# Altium integrated library Samtec_2_mm_Pitch_Socket_Strips.IntLib: 251 symbols (part 1 of 3) (continued)
## MMS-104-01-T-SV
designator J?
Tiger Claw(TM) Socket Strip, Through-hole, Vertical, -55 to 105 degC, 2 mm Pitch, 4-Pin, Female, RoHS; Manufacturer: Samtec; PartNumber: MMS-104-01-T-SV; Pitch: 2 mm; DatasheetVersion: F-214; PackageVersion: AO, 2/1993; PackageReference: MMS-104-01-X-SV; PackageDescription: 2mm Through Hole Box Connector Strip Assembly; Supplier 1: Digi-Key; Supplier Part Number 1: SAM1234-04-ND; Supplier 2: Newark; Supplier Part Number 2: 11P5302; Orientation: Vertical; RoHS: True; Temperature Range: -55 to 105 degC; Mounting Technology: Through-hole; ComponentLink1Description: Manufacturer URL; ComponentLink1URL: http://www.samtec.com; ComponentLink2Description: Datasheet; ComponentLink2URL: http://www.samtec.com/documents/webfiles/pdf/MMS.PDF; ComponentLink3Description: Package Specification; ComponentLink3URL: http://www.samtec.com/documents/webfiles/cpdf/MMS-1XX-01-XXX-XX-XXX-MKT1.pdf
footprint SMTC-MMS-104-01-X-SV (Through Hole Box Connector Strip Assembly, 1x4 Pins, Vertical, 2mm Pitch, Female)
pins: 1, 2, 3, 4

## MMS-104-02-F-DV
designator J?
Tiger Claw(TM) Socket Strip, Surface Mount, Vertical, -55 to 125 degC, 2 mm Pitch, 8-Pin, Female, RoHS; Manufacturer: Samtec; PartNumber: MMS-104-02-F-DV; Pitch: 2 mm; DatasheetVersion: F-214; PackageVersion: CI, 4/1994; PackageReference: MMS-104-02-X-DV; PackageDescription: 2mm Surface Mount Box Connector Strip ASM; Orientation: Vertical; RoHS: True; Temperature Range: -55 to 125 degC; Mounting Technology: Surface Mount; ComponentLink1Description: Manufacturer URL; ComponentLink1URL: http://www.samtec.com; ComponentLink2Description: Datasheet; ComponentLink2URL: http://www.samtec.com/documents/webfiles/pdf/MMS.PDF; ComponentLink3Description: Package Specification; ComponentLink3URL: http://www.samtec.com/documents/webfiles/cpdf/MMS-1XX-02-XXX-XX-XX-XXX-MKT.pdf
footprint SMTC-MMS-104-02-X-DV (Surface Mount Box Connector Strip ASM, 2x4 Pins, Vertical, 2mm Pitch, Female)
pins: 1, 2, 3, 4, 5, 6, 7, 8

## MMS-104-02-F-SH
designator J?
Tiger Claw(TM) Socket Strip, Surface Mount, Horizontal, -55 to 125 degC, 2 mm Pitch, 8-Pin, Female, RoHS; Manufacturer: Samtec; PartNumber: MMS-104-02-F-SH; Pitch: 2 mm; DatasheetVersion: F-214; PackageVersion: CI, 4/1994; PackageReference: MMS-104-02-X-SH; PackageDescription: 2mm Surface Mount Box Connector Strip ASM; Orientation: Horizontal; RoHS: True; Temperature Range: -55 to 125 degC; Mounting Technology: Surface Mount; ComponentLink1Description: Manufacturer URL; ComponentLink1URL: http://www.samtec.com; ComponentLink2Description: Datasheet; ComponentLink2URL: http://www.samtec.com/documents/webfiles/pdf/MMS.PDF; ComponentLink3Description: Package Specification; ComponentLink3URL: http://www.samtec.com/documents/webfiles/cpdf/MMS-1XX-02-XXX-XX-XX-XXX-MKT.pdf
footprint SMTC-MMS-104-02-X-SH (Surface Mount Box Connector Strip ASM, 2x4 Pins, Horizontal, 2mm Pitch, Female)
pins: 1A, 1B, 2A, 2B, 3A, 3B, 4A, 4B

## MMS-104-02-F-SV
designator J?
Tiger Claw(TM) Socket Strip, Surface Mount, Vertical, -55 to 125 degC, 2 mm Pitch, 4-Pin, Female, RoHS; Manufacturer: Samtec; PartNumber: MMS-104-02-F-SV; Pitch: 2 mm; DatasheetVersion: F-214; PackageVersion: CI, 4/1994; PackageReference: MMS-104-02-X-SV; PackageDescription: 2mm Surface Mount Box Connector Strip ASM; Orientation: Vertical; RoHS: True; Temperature Range: -55 to 125 degC; Mounting Technology: Surface Mount; ComponentLink1Description: Manufacturer URL; ComponentLink1URL: http://www.samtec.com; ComponentLink2Description: Datasheet; ComponentLink2URL: http://www.samtec.com/documents/webfiles/pdf/MMS.PDF; ComponentLink3Description: Package Specification; ComponentLink3URL: http://www.samtec.com/documents/webfiles/cpdf/MMS-1XX-02-XXX-XX-XX-XXX-MKT.pdf
footprint SMTC-MMS-104-02-X-SV (Surface Mount Box Connector Strip ASM, 4 Pins, Vertical, 2mm Pitch, Female)
pins: 1, 2, 3, 4

## MMS-104-02-L-DV
designator J?
Tiger Claw(TM) Socket Strip, Surface Mount, Vertical, -55 to 125 degC, 2 mm Pitch, 8-Pin, Female, RoHS; Manufacturer: Samtec; PartNumber: MMS-104-02-L-DV; Pitch: 2 mm; DatasheetVersion: F-214; PackageVersion: CI, 4/1994; PackageReference: MMS-104-02-X-DV; PackageDescription: 2mm Surface Mount Box Connector Strip ASM; Supplier 1: Digi-Key; Supplier Part Number 1: SAM1236-04-ND; Supplier 2: Newark; Supplier Part Number 2: 11P5304; Orientation: Vertical; RoHS: True; Temperature Range: -55 to 125 degC; Mounting Technology: Surface Mount; ComponentLink1Description: Manufacturer URL; ComponentLink1URL: http://www.samtec.com; ComponentLink2Description: Datasheet; ComponentLink2URL: http://www.samtec.com/documents/webfiles/pdf/MMS.PDF; ComponentLink3Description: Package Specification; ComponentLink3URL: http://www.samtec.com/documents/webfiles/cpdf/MMS-1XX-02-XXX-XX-XX-XXX-MKT.pdf
footprint SMTC-MMS-104-02-X-DV (Surface Mount Box Connector Strip ASM, 2x4 Pins, Vertical, 2mm Pitch, Female)
pins: 1, 2, 3, 4, 5, 6, 7, 8

## MMS-104-02-L-SH
designator J?
Tiger Claw(TM) Socket Strip, Surface Mount, Horizontal, -55 to 125 degC, 2 mm Pitch, 8-Pin, Female, RoHS; Manufacturer: Samtec; PartNumber: MMS-104-02-L-SH; Pitch: 2 mm; DatasheetVersion: F-214; PackageVersion: CI, 4/1994; PackageReference: MMS-104-02-X-SH; PackageDescription: 2mm Surface Mount Box Connector Strip ASM; Supplier 1: Digi-Key; Supplier Part Number 1: SAM1237-04-ND; Supplier 2: Newark; Supplier Part Number 2: 11P5305; Orientation: Horizontal; RoHS: True; Temperature Range: -55 to 125 degC; Mounting Technology: Surface Mount; ComponentLink1Description: Manufacturer URL; ComponentLink1URL: http://www.samtec.com; ComponentLink2Description: Datasheet; ComponentLink2URL: http://www.samtec.com/documents/webfiles/pdf/MMS.PDF; ComponentLink3Description: Package Specification; ComponentLink3URL: http://www.samtec.com/documents/webfiles/cpdf/MMS-1XX-02-XXX-XX-XX-XXX-MKT.pdf
footprint SMTC-MMS-104-02-X-SH (Surface Mount Box Connector Strip ASM, 2x4 Pins, Horizontal, 2mm Pitch, Female)
pins: 1A, 1B, 2A, 2B, 3A, 3B, 4A, 4B

## MMS-104-02-L-SV
designator J?
Tiger Claw(TM) Socket Strip, Surface Mount, Vertical, -55 to 125 degC, 2 mm Pitch, 4-Pin, Female, RoHS; Manufacturer: Samtec; PartNumber: MMS-104-02-L-SV; Pitch: 2 mm; DatasheetVersion: F-214; PackageVersion: CI, 4/1994; PackageReference: MMS-104-02-X-SV; PackageDescription: 2mm Surface Mount Box Connector Strip ASM; Supplier 1: Digi-Key; Supplier Part Number 1: MMS-104-02-L-SV-ND; Supplier 2: Digi-Key; Supplier Part Number 2: SAM1238-04-ND; Supplier 3: Farnell; Supplier Part Number 3: 2308474; Supplier 4: Newark; Supplier Part Number 4: 69W9895; Supplier 5: Newark; Supplier Part Number 5: 11P5306; Orientation: Vertical; RoHS: True; Temperature Range: -55 to 125 degC; Mounting Technology: Surface Mount; ComponentLink1Description: Manufacturer URL; ComponentLink1URL: http://www.samtec.com; ComponentLink2Description: Datasheet; ComponentLink2URL: http://www.samtec.com/documents/webfiles/pdf/MMS.PDF; ComponentLink3Description: Package Specification; ComponentLink3URL: http://www.samtec.com/documents/webfiles/cpdf/MMS-1XX-02-XXX-XX-XX-XXX-MKT.pdf
footprint SMTC-MMS-104-02-X-SV (Surface Mount Box Connector Strip ASM, 4 Pins, Vertical, 2mm Pitch, Female)
pins: 1, 2, 3, 4

## MMS-104-02-T-DV
designator J?
Tiger Claw(TM) Socket Strip, Surface Mount, Vertical, -55 to 105 degC, 2 mm Pitch, 8-Pin, Female, RoHS; Manufacturer: Samtec; PartNumber: MMS-104-02-T-DV; Pitch: 2 mm; DatasheetVersion: F-214; PackageVersion: CI, 4/1994; PackageReference: MMS-104-02-X-DV; PackageDescription: 2mm Surface Mount Box Connector Strip ASM; Supplier 1: Digi-Key; Supplier Part Number 1: SAM1240-04-ND; Orientation: Vertical; RoHS: True; Temperature Range: -55 to 105 degC; Mounting Technology: Surface Mount; ComponentLink1Description: Manufacturer URL; ComponentLink1URL: http://www.samtec.com; ComponentLink2Description: Datasheet; ComponentLink2URL: http://www.samtec.com/documents/webfiles/pdf/MMS.PDF; ComponentLink3Description: Package Specification; ComponentLink3URL: http://www.samtec.com/documents/webfiles/cpdf/MMS-1XX-02-XXX-XX-XX-XXX-MKT.pdf
footprint SMTC-MMS-104-02-X-DV (Surface Mount Box Connector Strip ASM, 2x4 Pins, Vertical, 2mm Pitch, Female)
pins: 1, 2, 3, 4, 5, 6, 7, 8

## MMS-104-02-T-SH
designator J?
Tiger Claw(TM) Socket Strip, Surface Mount, Horizontal, -55 to 105 degC, 2 mm Pitch, 8-Pin, Female, RoHS; Manufacturer: Samtec; PartNumber: MMS-104-02-T-SH; Pitch: 2 mm; DatasheetVersion: F-214; PackageVersion: CI, 4/1994; PackageReference: MMS-104-02-X-SH; PackageDescription: 2mm Surface Mount Box Connector Strip ASM; Supplier 1: Digi-Key; Supplier Part Number 1: SAM1241-04-ND; Supplier 2: Newark; Supplier Part Number 2: 11P5309; Orientation: Horizontal; RoHS: True; Temperature Range: -55 to 105 degC; Mounting Technology: Surface Mount; ComponentLink1Description: Manufacturer URL; ComponentLink1URL: http://www.samtec.com; ComponentLink2Description: Datasheet; ComponentLink2URL: http://www.samtec.com/documents/webfiles/pdf/MMS.PDF; ComponentLink3Description: Package Specification; ComponentLink3URL: http://www.samtec.com/documents/webfiles/cpdf/MMS-1XX-02-XXX-XX-XX-XXX-MKT.pdf
footprint SMTC-MMS-104-02-X-SH (Surface Mount Box Connector Strip ASM, 2x4 Pins, Horizontal, 2mm Pitch, Female)
pins: 1A, 1B, 2A, 2B, 3A, 3B, 4A, 4B

## MMS-104-02-T-SV
designator J?
Tiger Claw(TM) Socket Strip, Surface Mount, Vertical, -55 to 105 degC, 2 mm Pitch, 4-Pin, Female, RoHS; Manufacturer: Samtec; PartNumber: MMS-104-02-T-SV; Pitch: 2 mm; DatasheetVersion: F-214; PackageVersion: CI, 4/1994; PackageReference: MMS-104-02-X-SV; PackageDescription: 2mm Surface Mount Box Connector Strip ASM; Supplier 1: Digi-Key; Supplier Part Number 1: SAM1242-04-ND; Orientation: Vertical; RoHS: True; Temperature Range: -55 to 105 degC; Mounting Technology: Surface Mount; ComponentLink1Description: Manufacturer URL; ComponentLink1URL: http://www.samtec.com; ComponentLink2Description: Datasheet; ComponentLink2URL: http://www.samtec.com/documents/webfiles/pdf/MMS.PDF; ComponentLink3Description: Package Specification; ComponentLink3URL: http://www.samtec.com/documents/webfiles/cpdf/MMS-1XX-02-XXX-XX-XX-XXX-MKT.pdf
footprint SMTC-MMS-104-02-X-SV (Surface Mount Box Connector Strip ASM, 4 Pins, Vertical, 2mm Pitch, Female)
pins: 1, 2, 3, 4

## MMS-105-02-F-SH
designator J?
Tiger Claw(TM) Socket Strip, Surface Mount, Horizontal, -55 to 125 degC, 2 mm Pitch, 10-Pin, Female, RoHS; Manufacturer: Samtec; PartNumber: MMS-105-02-F-SH; Pitch: 2 mm; DatasheetVersion: F-214; PackageVersion: CI, 4/1994; PackageReference: MMS-105-02-X-SH; PackageDescription: 2mm Surface Mount Box Connector Strip ASM; Orientation: Horizontal; RoHS: True; Temperature Range: -55 to 125 degC; Mounting Technology: Surface Mount; ComponentLink1Description: Manufacturer URL; ComponentLink1URL: http://www.samtec.com; ComponentLink2Description: Datasheet; ComponentLink2URL: http://www.samtec.com/documents/webfiles/pdf/MMS.PDF; ComponentLink3Description: Package Specification; ComponentLink3URL: http://www.samtec.com/documents/webfiles/cpdf/MMS-1XX-02-XXX-XX-XX-XXX-MKT.pdf
footprint SMTC-MMS-105-02-X-SH (Surface Mount Box Connector Strip ASM, 2x5 Pins, Horizontal, 2mm Pitch, Female)
pins: 1A, 1B, 2A, 2B, 3A, 3B, 4A, 4B, 5A, 5B

## MMS-105-02-L-SH
designator J?
Tiger Claw(TM) Socket Strip, Surface Mount, Horizontal, -55 to 125 degC, 2 mm Pitch, 10-Pin, Female, RoHS; Manufacturer: Samtec; PartNumber: MMS-105-02-L-SH; Pitch: 2 mm; DatasheetVersion: F-214; PackageVersion: CI, 4/1994; PackageReference: MMS-105-02-X-SH; PackageDescription: 2mm Surface Mount Box Connector Strip ASM; Supplier 1: Digi-Key; Supplier Part Number 1: SAM1237-05-ND; Supplier 2: Newark; Supplier Part Number 2: 11P5321; Orientation: Horizontal; RoHS: True; Temperature Range: -55 to 125 degC; Mounting Technology: Surface Mount; ComponentLink1Description: Manufacturer URL; ComponentLink1URL: http://www.samtec.com; ComponentLink2Description: Datasheet; ComponentLink2URL: http://www.samtec.com/documents/webfiles/pdf/MMS.PDF; ComponentLink3Description: Package Specification; ComponentLink3URL: http://www.samtec.com/documents/webfiles/cpdf/MMS-1XX-02-XXX-XX-XX-XXX-MKT.pdf
footprint SMTC-MMS-105-02-X-SH (Surface Mount Box Connector Strip ASM, 2x5 Pins, Horizontal, 2mm Pitch, Female)
pins: 1A, 1B, 2A, 2B, 3A, 3B, 4A, 4B, 5A, 5B

## MMS-105-02-T-SH
designator J?
Tiger Claw(TM) Socket Strip, Surface Mount, Horizontal, -55 to 105 degC, 2 mm Pitch, 10-Pin, Female, RoHS; Manufacturer: Samtec; PartNumber: MMS-105-02-T-SH; Pitch: 2 mm; DatasheetVersion: F-214; PackageVersion: CI, 4/1994; PackageReference: MMS-105-02-X-SH; PackageDescription: 2mm Surface Mount Box Connector Strip ASM; Supplier 1: Digi-Key; Supplier Part Number 1: SAM1241-05-ND; Orientation: Horizontal; RoHS: True; Temperature Range: -55 to 105 degC; Mounting Technology: Surface Mount; ComponentLink1Description: Manufacturer URL; ComponentLink1URL: http://www.samtec.com; ComponentLink2Description: Datasheet; ComponentLink2URL: http://www.samtec.com/documents/webfiles/pdf/MMS.PDF; ComponentLink3Description: Package Specification; ComponentLink3URL: http://www.samtec.com/documents/webfiles/cpdf/MMS-1XX-02-XXX-XX-XX-XXX-MKT.pdf
footprint SMTC-MMS-105-02-X-SH (Surface Mount Box Connector Strip ASM, 2x5 Pins, Horizontal, 2mm Pitch, Female)
pins: 1A, 1B, 2A, 2B, 3A, 3B, 4A, 4B, 5A, 5B

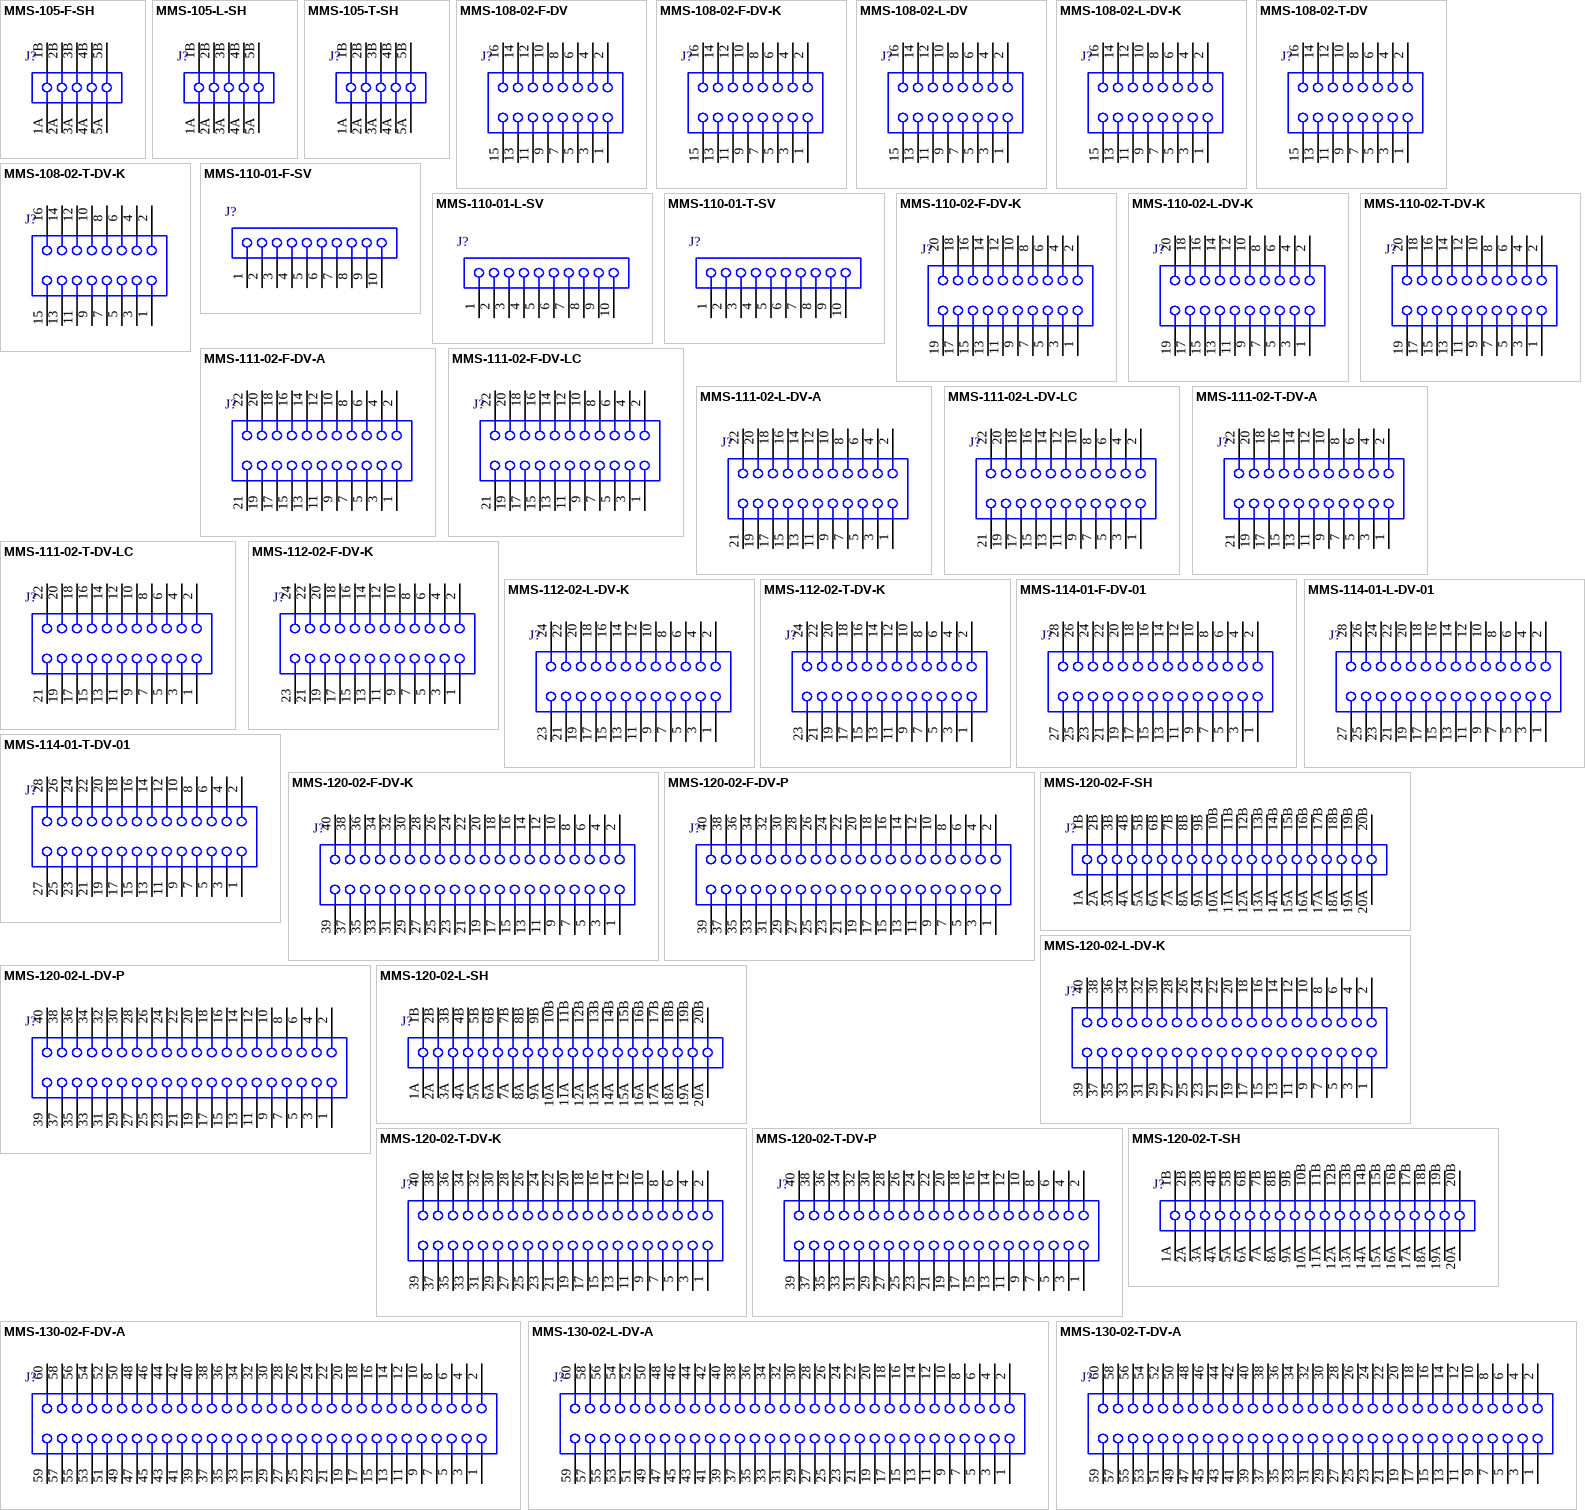
[diagram p2: symbols MMS-105-F-SH to MMS-130-02-T-DV-A]

## MMS-105-F-SH
designator J?
Tiger Claw(TM) Socket Strip, Surface Mount, Horizontal, -55 to 125 degC, 2 mm Pitch, 10-Pin, Female, RoHS; Manufacturer: Samtec; PartNumber: MMS-105-F-SH; Pitch: 2 mm; DatasheetVersion: F-214; PackageVersion: CI, 4/1994; PackageReference: MMS-105-X-SH; PackageDescription: 2mm Surface Mount Box Connector Strip ASM; Orientation: Horizontal; RoHS: True; Temperature Range: -55 to 125 degC; Mounting Technology: Surface Mount; ComponentLink1Description: Manufacturer URL; ComponentLink1URL: http://www.samtec.com; ComponentLink2Description: Datasheet; ComponentLink2URL: http://www.samtec.com/documents/webfiles/pdf/MMS.PDF; ComponentLink3Description: Package Specification; ComponentLink3URL: http://www.samtec.com/documents/webfiles/cpdf/MMS-1XX-02-XXX-XX-XX-XXX-MKT.pdf
footprint SMTC-MMS-105-X-SH (Surface Mount Box Connector Strip ASM, 2x5 Pins, Horizontal, 2mm Pitch, Female)
pins: 1A, 1B, 2A, 2B, 3A, 3B, 4A, 4B, 5A, 5B

## MMS-105-L-SH
designator J?
Tiger Claw(TM) Socket Strip, Surface Mount, Horizontal, -55 to 125 degC, 2 mm Pitch, 10-Pin, Female, RoHS; Manufacturer: Samtec; PartNumber: MMS-105-L-SH; Pitch: 2 mm; DatasheetVersion: F-214; PackageVersion: CI, 4/1994; PackageReference: MMS-105-X-SH; PackageDescription: 2mm Surface Mount Box Connector Strip ASM; Orientation: Horizontal; RoHS: True; Temperature Range: -55 to 125 degC; Mounting Technology: Surface Mount; ComponentLink1Description: Manufacturer URL; ComponentLink1URL: http://www.samtec.com; ComponentLink2Description: Datasheet; ComponentLink2URL: http://www.samtec.com/documents/webfiles/pdf/MMS.PDF; ComponentLink3Description: Package Specification; ComponentLink3URL: http://www.samtec.com/documents/webfiles/cpdf/MMS-1XX-02-XXX-XX-XX-XXX-MKT.pdf
footprint SMTC-MMS-105-X-SH (Surface Mount Box Connector Strip ASM, 2x5 Pins, Horizontal, 2mm Pitch, Female)
pins: 1A, 1B, 2A, 2B, 3A, 3B, 4A, 4B, 5A, 5B

## MMS-105-T-SH
designator J?
Tiger Claw(TM) Socket Strip, Surface Mount, Horizontal, -55 to 105 degC, 2 mm Pitch, 10-Pin, Female, RoHS; Manufacturer: Samtec; PartNumber: MMS-105-T-SH; Pitch: 2 mm; DatasheetVersion: F-214; PackageVersion: CI, 4/1994; PackageReference: MMS-105-X-SH; PackageDescription: 2mm Surface Mount Box Connector Strip ASM; Orientation: Horizontal; RoHS: True; Temperature Range: -55 to 105 degC; Mounting Technology: Surface Mount; ComponentLink1Description: Manufacturer URL; ComponentLink1URL: http://www.samtec.com; ComponentLink2Description: Datasheet; ComponentLink2URL: http://www.samtec.com/documents/webfiles/pdf/MMS.PDF; ComponentLink3Description: Package Specification; ComponentLink3URL: http://www.samtec.com/documents/webfiles/cpdf/MMS-1XX-02-XXX-XX-XX-XXX-MKT.pdf
footprint SMTC-MMS-105-X-SH (Surface Mount Box Connector Strip ASM, 2x5 Pins, Horizontal, 2mm Pitch, Female)
pins: 1A, 1B, 2A, 2B, 3A, 3B, 4A, 4B, 5A, 5B

## MMS-108-02-F-DV
designator J?
Tiger Claw(TM) Socket Strip, Surface Mount, Vertical, -55 to 125 degC, 2 mm Pitch, 16-Pin, Female, RoHS; Manufacturer: Samtec; PartNumber: MMS-108-02-F-DV; Pitch: 2 mm; DatasheetVersion: F-214; PackageVersion: CI, 4/1994; PackageReference: MMS-108-02-X-DV; PackageDescription: 2mm Surface Mount Box Connector Strip ASM; Orientation: Vertical; RoHS: True; Temperature Range: -55 to 125 degC; Mounting Technology: Surface Mount; ComponentLink1Description: Manufacturer URL; ComponentLink1URL: http://www.samtec.com; ComponentLink2Description: Datasheet; ComponentLink2URL: http://www.samtec.com/documents/webfiles/pdf/MMS.PDF; ComponentLink3Description: Package Specification; ComponentLink3URL: http://www.samtec.com/documents/webfiles/cpdf/MMS-1XX-02-XXX-XX-XX-XXX-MKT.pdf
footprint SMTC-MMS-108-02-X-DV (Surface Mount Box Connector Strip ASM, 2x8 Pins, Vertical, 2mm Pitch, Female)
pins: 1, 2, 3, 4, 5, 6, 7, 8, 9, 10, 11, 12, 13, 14, 15, 16

## MMS-108-02-F-DV-K
designator J?
Tiger Claw(TM) Socket Strip, Surface Mount, Vertical, -55 to 125 degC, 2 mm Pitch, 16-Pin, Female, RoHS; Manufacturer: Samtec; PartNumber: MMS-108-02-F-DV-K; Pitch: 2 mm; DatasheetVersion: F-214; PackageVersion: CI, 4/1994; PackageReference: MMS-108-02-X-DV-K; PackageDescription: 2mm Surface Mount Box Connector Strip ASM; Orientation: Vertical; RoHS: True; Temperature Range: -55 to 125 degC; Mounting Technology: Surface Mount; ComponentLink1Description: Manufacturer URL; ComponentLink1URL: http://www.samtec.com; ComponentLink2Description: Datasheet; ComponentLink2URL: http://www.samtec.com/documents/webfiles/pdf/MMS.PDF; ComponentLink3Description: Package Specification; ComponentLink3URL: http://www.samtec.com/documents/webfiles/cpdf/MMS-1XX-02-XXX-XX-XX-XXX-MKT.pdf
footprint SMTC-MMS-108-02-X-DV-K (Surface Mount Box Connector Strip ASM, 2x8 Pins, Vertical, 2mm Pitch, Female)
pins: 1, 2, 3, 4, 5, 6, 7, 8, 9, 10, 11, 12, 13, 14, 15, 16

## MMS-108-02-L-DV
designator J?
Tiger Claw(TM) Socket Strip, Surface Mount, Vertical, -55 to 125 degC, 2 mm Pitch, 16-Pin, Female, RoHS; Manufacturer: Samtec; PartNumber: MMS-108-02-L-DV; Pitch: 2 mm; DatasheetVersion: F-214; PackageVersion: CI, 4/1994; PackageReference: MMS-108-02-X-DV; PackageDescription: 2mm Surface Mount Box Connector Strip ASM; Supplier 1: Digi-Key; Supplier Part Number 1: SAM1236-08-ND; Supplier 2: Newark; Supplier Part Number 2: 11P5368; Orientation: Vertical; RoHS: True; Temperature Range: -55 to 125 degC; Mounting Technology: Surface Mount; ComponentLink1Description: Manufacturer URL; ComponentLink1URL: http://www.samtec.com; ComponentLink2Description: Datasheet; ComponentLink2URL: http://www.samtec.com/documents/webfiles/pdf/MMS.PDF; ComponentLink3Description: Package Specification; ComponentLink3URL: http://www.samtec.com/documents/webfiles/cpdf/MMS-1XX-02-XXX-XX-XX-XXX-MKT.pdf
footprint SMTC-MMS-108-02-X-DV (Surface Mount Box Connector Strip ASM, 2x8 Pins, Vertical, 2mm Pitch, Female)
pins: 1, 2, 3, 4, 5, 6, 7, 8, 9, 10, 11, 12, 13, 14, 15, 16

## MMS-108-02-L-DV-K
designator J?
Tiger Claw(TM) Socket Strip, Surface Mount, Vertical, -55 to 125 degC, 2 mm Pitch, 16-Pin, Female, RoHS; Manufacturer: Samtec; PartNumber: MMS-108-02-L-DV-K; Pitch: 2 mm; DatasheetVersion: F-214; PackageVersion: CI, 4/1994; PackageReference: MMS-108-02-X-DV-K; PackageDescription: 2mm Surface Mount Box Connector Strip ASM; Orientation: Vertical; RoHS: True; Temperature Range: -55 to 125 degC; Mounting Technology: Surface Mount; ComponentLink1Description: Manufacturer URL; ComponentLink1URL: http://www.samtec.com; ComponentLink2Description: Datasheet; ComponentLink2URL: http://www.samtec.com/documents/webfiles/pdf/MMS.PDF; ComponentLink3Description: Package Specification; ComponentLink3URL: http://www.samtec.com/documents/webfiles/cpdf/MMS-1XX-02-XXX-XX-XX-XXX-MKT.pdf
footprint SMTC-MMS-108-02-X-DV-K (Surface Mount Box Connector Strip ASM, 2x8 Pins, Vertical, 2mm Pitch, Female)
pins: 1, 2, 3, 4, 5, 6, 7, 8, 9, 10, 11, 12, 13, 14, 15, 16

## MMS-108-02-T-DV
designator J?
Tiger Claw(TM) Socket Strip, Surface Mount, Vertical, -55 to 105 degC, 2 mm Pitch, 16-Pin, Female, RoHS; Manufacturer: Samtec; PartNumber: MMS-108-02-T-DV; Pitch: 2 mm; DatasheetVersion: F-214; PackageVersion: CI, 4/1994; PackageReference: MMS-108-02-X-DV; PackageDescription: 2mm Surface Mount Box Connector Strip ASM; Supplier 1: Digi-Key; Supplier Part Number 1: SAM1240-08-ND; Orientation: Vertical; RoHS: True; Temperature Range: -55 to 105 degC; Mounting Technology: Surface Mount; ComponentLink1Description: Manufacturer URL; ComponentLink1URL: http://www.samtec.com; ComponentLink2Description: Datasheet; ComponentLink2URL: http://www.samtec.com/documents/webfiles/pdf/MMS.PDF; ComponentLink3Description: Package Specification; ComponentLink3URL: http://www.samtec.com/documents/webfiles/cpdf/MMS-1XX-02-XXX-XX-XX-XXX-MKT.pdf
footprint SMTC-MMS-108-02-X-DV (Surface Mount Box Connector Strip ASM, 2x8 Pins, Vertical, 2mm Pitch, Female)
pins: 1, 2, 3, 4, 5, 6, 7, 8, 9, 10, 11, 12, 13, 14, 15, 16

## MMS-108-02-T-DV-K
designator J?
Tiger Claw(TM) Socket Strip, Surface Mount, Vertical, -55 to 105 degC, 2 mm Pitch, 16-Pin, Female, RoHS; Manufacturer: Samtec; PartNumber: MMS-108-02-T-DV-K; Pitch: 2 mm; DatasheetVersion: F-214; PackageVersion: CI, 4/1994; PackageReference: MMS-108-02-X-DV-K; PackageDescription: 2mm Surface Mount Box Connector Strip ASM; Orientation: Vertical; RoHS: True; Temperature Range: -55 to 105 degC; Mounting Technology: Surface Mount; ComponentLink1Description: Manufacturer URL; ComponentLink1URL: http://www.samtec.com; ComponentLink2Description: Datasheet; ComponentLink2URL: http://www.samtec.com/documents/webfiles/pdf/MMS.PDF; ComponentLink3Description: Package Specification; ComponentLink3URL: http://www.samtec.com/documents/webfiles/cpdf/MMS-1XX-02-XXX-XX-XX-XXX-MKT.pdf
footprint SMTC-MMS-108-02-X-DV-K (Surface Mount Box Connector Strip ASM, 2x8 Pins, Vertical, 2mm Pitch, Female)
pins: 1, 2, 3, 4, 5, 6, 7, 8, 9, 10, 11, 12, 13, 14, 15, 16

## MMS-110-01-F-SV
designator J?
Tiger Claw(TM) Socket Strip, Through-hole, Vertical, -55 to 125 degC, 2 mm Pitch, 10-Pin, Female, RoHS; Manufacturer: Samtec; PartNumber: MMS-110-01-F-SV; Pitch: 2 mm; DatasheetVersion: F-214; PackageVersion: AO, 2/1993; PackageReference: MMS-110-01-X-SV; PackageDescription: 2mm Through Hole Box Connector Strip Assembly; Supplier 1: Newark; Supplier Part Number 1: 28W0074; Orientation: Vertical; RoHS: True; Temperature Range: -55 to 125 degC; Mounting Technology: Through-hole; ComponentLink1Description: Manufacturer URL; ComponentLink1URL: http://www.samtec.com; ComponentLink2Description: Datasheet; ComponentLink2URL: http://www.samtec.com/documents/webfiles/pdf/MMS.PDF; ComponentLink3Description: Package Specification; ComponentLink3URL: http://www.samtec.com/documents/webfiles/cpdf/MMS-1XX-01-XXX-XX-XXX-MKT1.pdf
footprint SMTC-MMS-110-01-X-SV (Through Hole Box Connector Strip Assembly, 1x10 Pins, Vertical, 2mm Pitch, Female)
pins: 1, 2, 3, 4, 5, 6, 7, 8, 9, 10

## MMS-110-01-L-SV
designator J?
Tiger Claw(TM) Socket Strip, Through-hole, Vertical, -55 to 125 degC, 2 mm Pitch, 10-Pin, Female, RoHS; Manufacturer: Samtec; PartNumber: MMS-110-01-L-SV; Pitch: 2 mm; DatasheetVersion: F-214; PackageVersion: AO, 2/1993; PackageReference: MMS-110-01-X-SV; PackageDescription: 2mm Through Hole Box Connector Strip Assembly; Supplier 1: Digi-Key; Supplier Part Number 1: SAM1230-10-ND; Supplier 2: Farnell; Supplier Part Number 2: 1885919; Supplier 3: Newark; Supplier Part Number 3: 41T0710; Supplier 4: Newark; Supplier Part Number 4: 96M0485; Orientation: Vertical; RoHS: True; Temperature Range: -55 to 125 degC; Mounting Technology: Through-hole; ComponentLink1Description: Manufacturer URL; ComponentLink1URL: http://www.samtec.com; ComponentLink2Description: Datasheet; ComponentLink2URL: http://www.samtec.com/documents/webfiles/pdf/MMS.PDF; ComponentLink3Description: Package Specification; ComponentLink3URL: http://www.samtec.com/documents/webfiles/cpdf/MMS-1XX-01-XXX-XX-XXX-MKT1.pdf
footprint SMTC-MMS-110-01-X-SV (Through Hole Box Connector Strip Assembly, 1x10 Pins, Vertical, 2mm Pitch, Female)
pins: 1, 2, 3, 4, 5, 6, 7, 8, 9, 10

## MMS-110-01-T-SV
designator J?
Tiger Claw(TM) Socket Strip, Through-hole, Vertical, -55 to 105 degC, 2 mm Pitch, 10-Pin, Female, RoHS; Manufacturer: Samtec; PartNumber: MMS-110-01-T-SV; Pitch: 2 mm; DatasheetVersion: F-214; PackageVersion: AO, 2/1993; PackageReference: MMS-110-01-X-SV; PackageDescription: 2mm Through Hole Box Connector Strip Assembly; Supplier 1: Digi-Key; Supplier Part Number 1: SAM1234-10-ND; Supplier 2: Newark; Supplier Part Number 2: 11P5397; Orientation: Vertical; RoHS: True; Temperature Range: -55 to 105 degC; Mounting Technology: Through-hole; ComponentLink1Description: Manufacturer URL; ComponentLink1URL: http://www.samtec.com; ComponentLink2Description: Datasheet; ComponentLink2URL: http://www.samtec.com/documents/webfiles/pdf/MMS.PDF; ComponentLink3Description: Package Specification; ComponentLink3URL: http://www.samtec.com/documents/webfiles/cpdf/MMS-1XX-01-XXX-XX-XXX-MKT1.pdf
footprint SMTC-MMS-110-01-X-SV (Through Hole Box Connector Strip Assembly, 1x10 Pins, Vertical, 2mm Pitch, Female)
pins: 1, 2, 3, 4, 5, 6, 7, 8, 9, 10

## MMS-110-02-F-DV-K
designator J?
Tiger Claw(TM) Socket Strip, Surface Mount, Vertical, -55 to 125 degC, 2 mm Pitch, 20-Pin, Female, RoHS; Manufacturer: Samtec; PartNumber: MMS-110-02-F-DV-K; Pitch: 2 mm; DatasheetVersion: F-214; PackageVersion: CI, 4/1994; PackageReference: MMS-110-02-X-DV-K; PackageDescription: 2mm Surface Mount Box Connector Strip ASM; Orientation: Vertical; RoHS: True; Temperature Range: -55 to 125 degC; Mounting Technology: Surface Mount; ComponentLink1Description: Manufacturer URL; ComponentLink1URL: http://www.samtec.com; ComponentLink2Description: Datasheet; ComponentLink2URL: http://www.samtec.com/documents/webfiles/pdf/MMS.PDF; ComponentLink3Description: Package Specification; ComponentLink3URL: http://www.samtec.com/documents/webfiles/cpdf/MMS-1XX-02-XXX-XX-XX-XXX-MKT.pdf
footprint SMTC-MMS-110-02-X-DV-K (Surface Mount Box Connector Strip ASM, 2x10 Pins, Vertical, 2mm Pitch, Female)
pins: 1, 2, 3, 4, 5, 6, 7, 8, 9, 10, 11, 12, 13, 14, 15, 16, 17, 18, 19, 20

## MMS-110-02-L-DV-K
designator J?
Tiger Claw(TM) Socket Strip, Surface Mount, Vertical, -55 to 125 degC, 2 mm Pitch, 20-Pin, Female, RoHS; Manufacturer: Samtec; PartNumber: MMS-110-02-L-DV-K; Pitch: 2 mm; DatasheetVersion: F-214; PackageVersion: CI, 4/1994; PackageReference: MMS-110-02-X-DV-K; PackageDescription: 2mm Surface Mount Box Connector Strip ASM; Orientation: Vertical; RoHS: True; Temperature Range: -55 to 125 degC; Mounting Technology: Surface Mount; ComponentLink1Description: Manufacturer URL; ComponentLink1URL: http://www.samtec.com; ComponentLink2Description: Datasheet; ComponentLink2URL: http://www.samtec.com/documents/webfiles/pdf/MMS.PDF; ComponentLink3Description: Package Specification; ComponentLink3URL: http://www.samtec.com/documents/webfiles/cpdf/MMS-1XX-02-XXX-XX-XX-XXX-MKT.pdf
footprint SMTC-MMS-110-02-X-DV-K (Surface Mount Box Connector Strip ASM, 2x10 Pins, Vertical, 2mm Pitch, Female)
pins: 1, 2, 3, 4, 5, 6, 7, 8, 9, 10, 11, 12, 13, 14, 15, 16, 17, 18, 19, 20

## MMS-110-02-T-DV-K
designator J?
Tiger Claw(TM) Socket Strip, Surface Mount, Vertical, -55 to 105 degC, 2 mm Pitch, 20-Pin, Female, RoHS; Manufacturer: Samtec; PartNumber: MMS-110-02-T-DV-K; Pitch: 2 mm; DatasheetVersion: F-214; PackageVersion: CI, 4/1994; PackageReference: MMS-110-02-X-DV-K; PackageDescription: 2mm Surface Mount Box Connector Strip ASM; Orientation: Vertical; RoHS: True; Temperature Range: -55 to 105 degC; Mounting Technology: Surface Mount; ComponentLink1Description: Manufacturer URL; ComponentLink1URL: http://www.samtec.com; ComponentLink2Description: Datasheet; ComponentLink2URL: http://www.samtec.com/documents/webfiles/pdf/MMS.PDF; ComponentLink3Description: Package Specification; ComponentLink3URL: http://www.samtec.com/documents/webfiles/cpdf/MMS-1XX-02-XXX-XX-XX-XXX-MKT.pdf
footprint SMTC-MMS-110-02-X-DV-K (Surface Mount Box Connector Strip ASM, 2x10 Pins, Vertical, 2mm Pitch, Female)
pins: 1, 2, 3, 4, 5, 6, 7, 8, 9, 10, 11, 12, 13, 14, 15, 16, 17, 18, 19, 20

## MMS-111-02-F-DV-A
designator J?
Tiger Claw(TM) Socket Strip, Surface Mount, Vertical, -55 to 125 degC, 2 mm Pitch, 22-Pin, Female, RoHS; Manufacturer: Samtec; PartNumber: MMS-111-02-F-DV-A; Pitch: 2 mm; DatasheetVersion: F-214; PackageVersion: CI, 4/1994; PackageReference: MMS-111-02-X-DV-A; PackageDescription: 2mm Surface Mount Box Connector Strip ASM; Orientation: Vertical; RoHS: True; Temperature Range: -55 to 125 degC; Mounting Technology: Surface Mount; ComponentLink1Description: Manufacturer URL; ComponentLink1URL: http://www.samtec.com; ComponentLink2Description: Datasheet; ComponentLink2URL: http://www.samtec.com/documents/webfiles/pdf/MMS.PDF; ComponentLink3Description: Package Specification; ComponentLink3URL: http://www.samtec.com/documents/webfiles/cpdf/MMS-1XX-02-XXX-XX-XX-XXX-MKT.pdf
footprint SMTC-MMS-111-02-X-DV-A (Surface Mount Box Connector Strip ASM, 2x11 Pins, Vertical, 2mm Pitch, Female)
pins: 1, 2, 3, 4, 5, 6, 7, 8, 9, 10, 11, 12, 13, 14, 15, 16, 17, 18, 19, 20, 21, 22

## MMS-111-02-F-DV-LC
designator J?
Tiger Claw(TM) Socket Strip, Surface Mount, Vertical, -55 to 125 degC, 2 mm Pitch, 22-Pin, Female, RoHS; Manufacturer: Samtec; PartNumber: MMS-111-02-F-DV-LC; Pitch: 2 mm; DatasheetVersion: F-214; PackageVersion: CI, 4/1994; PackageReference: MMS-111-02-X-DV-LC; PackageDescription: 2mm Surface Mount Box Connector Strip ASM; Orientation: Vertical; RoHS: True; Temperature Range: -55 to 125 degC; Mounting Technology: Surface Mount; ComponentLink1Description: Manufacturer URL; ComponentLink1URL: http://www.samtec.com; ComponentLink2Description: Datasheet; ComponentLink2URL: http://www.samtec.com/documents/webfiles/pdf/MMS.PDF; ComponentLink3Description: Package Specification; ComponentLink3URL: http://www.samtec.com/documents/webfiles/cpdf/MMS-1XX-02-XXX-XX-XX-XXX-MKT.pdf
footprint SMTC-MMS-111-02-X-DV-LC (Surface Mount Box Connector Strip ASM, 2x11 Pins, Vertical, 2mm Pitch, Female)
pins: 1, 2, 3, 4, 5, 6, 7, 8, 9, 10, 11, 12, 13, 14, 15, 16, 17, 18, 19, 20, 21, 22
